# Altium footprint library JL_PCB.PCBLIB: 1112 footprints (part 5 of 71)
Each footprint in its own frame and in the unit in brackets; x right, y up, seen from the top. Pads: shape width x height; smd on the part's side, far side on the other; paste and mask are expansions set on the pad; w line width, h text height; cw(c..) or ccw(c..) is an arc to the next point about the centre after c.
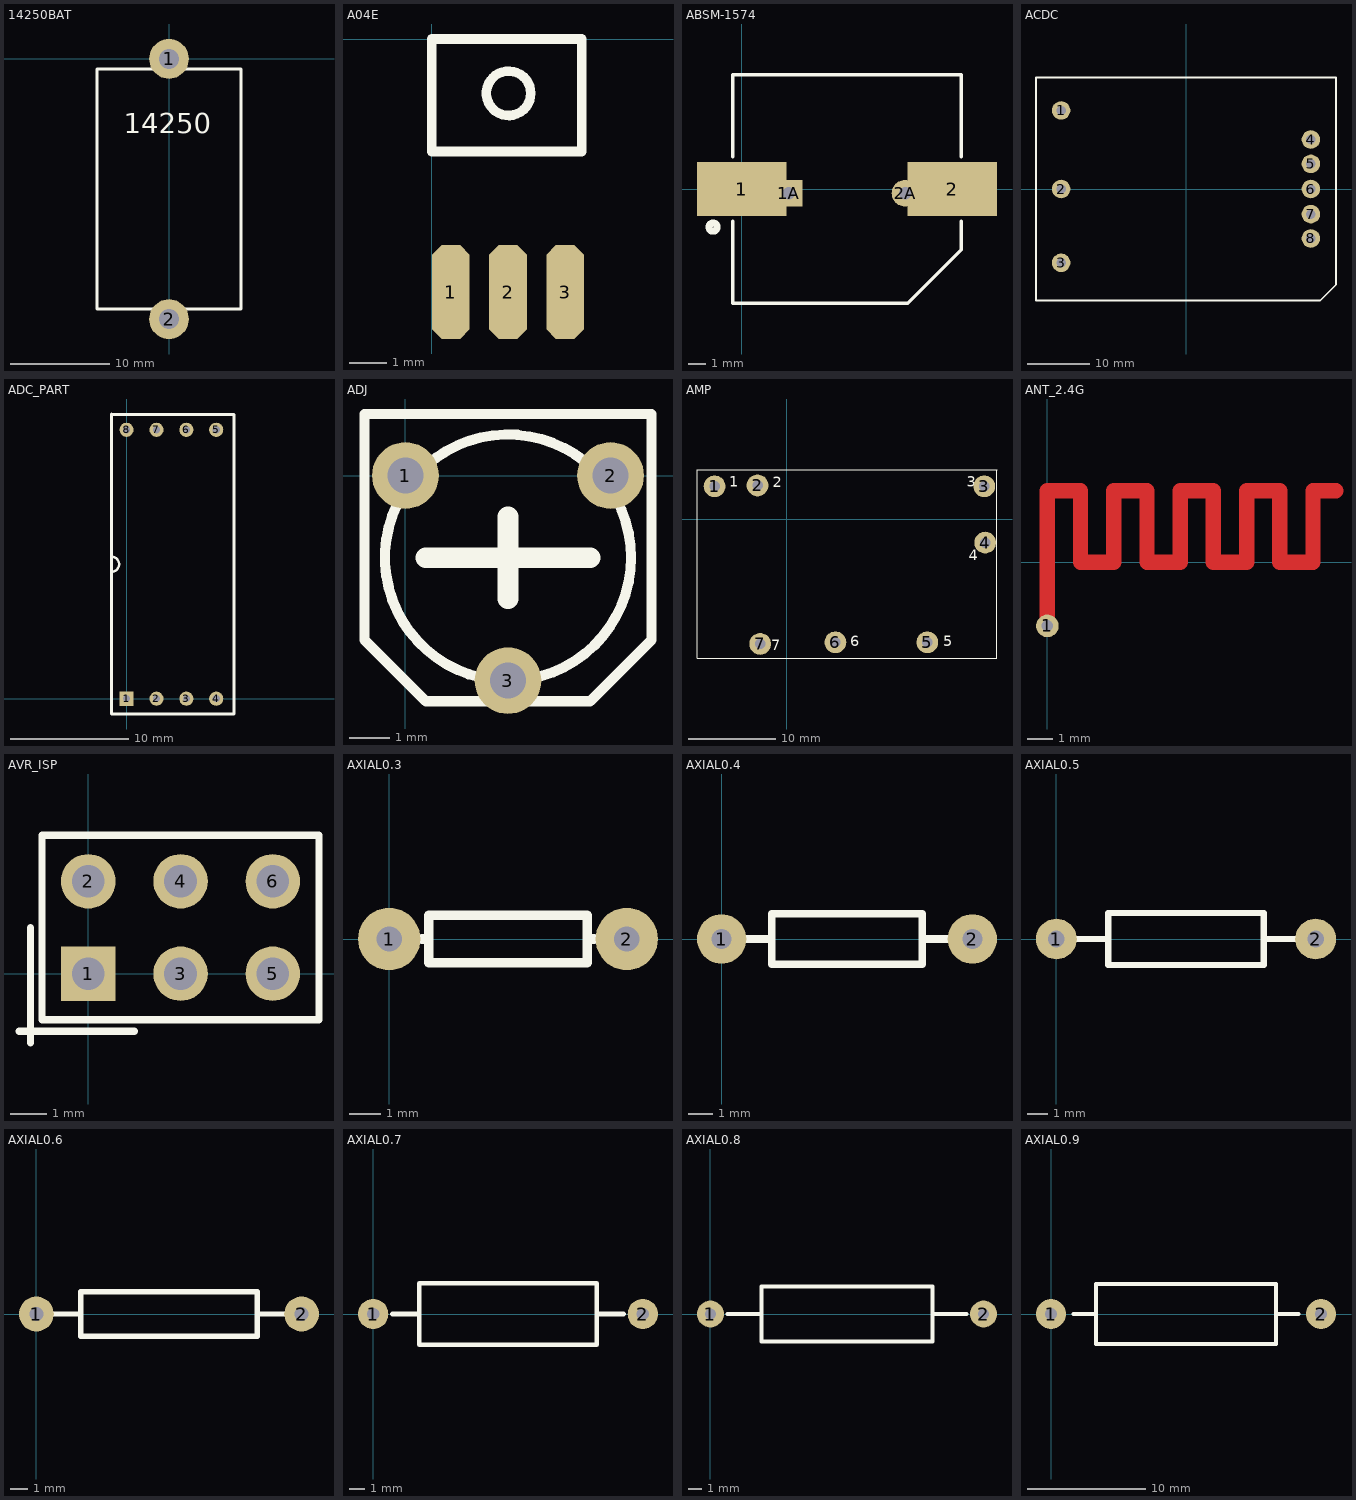
[diagram p4: the footprints below, top view; thin cyan lines are the x and y axes]

## 14250BAT [mm]
pads (2):
  round 4 hole 2: 1(0,0) 2(0,-26.162)
TopOverlay:
  lines w0.254: -7.239,-25.146 0,-25.146 7.239,-25.146 7.239,-1.016 -7.239,-1.016 -7.239,-25.146
  text "14250" at -4.572,-7.493 h2

## A04E [mm] "A04E"
pads (3):
  oct 1x2.5 smd: 1(0.51,-6.75) 2(2.034,-6.75) 3(3.558,-6.75)
TopOverlay:
  circle w0.254: c2.049,-1.448 r0.592
  lines w0.254: 0,-3 4,-3 4,0 0,0 0,-3
3D body "User Library-UA SIP model.step": height 1.59, standoff 0.02, extent -0.055,-9.472 4.115,0.138

## ABSM-1574 [mm] "Magnetic Transducer Buzzer"
pads (4):
  rect 5x3 smd: 1(0,0) 2(11.8,0)
  rect 1.5x1.5 hole 0.7: 1A(2.65,-0.24)
  round 1.5 hole 0.7: 2A(9.15,-0.24)
TopOverlay:
  circle w0.4: c-1.6,-2.134 r0.227
  lines w0.2: -0.5,-1.8 -0.5,-6.4 9.3,-6.4 12.3,-3.4 12.3,-1.8 ; -0.5,1.8 -0.5,6.4 12.3,6.4 12.3,1.8

## ACDC [mm]
pads (8):
  round 3 hole 1.5: 1(-20.193,12.7) 2(-20.193,0) 3(-20.193,-11.938) 4(20.193,8.001) 5(20.193,4.064) 6(20.193,0) 7(20.193,-4.064) 8(20.193,-8.001)
TopOverlay:
  lines w0.254: -24.257,-18.034 -24.257,18.034 24.257,18.034 24.257,-15.494 21.717,-18.034 -24.257,-18.034

## ADC_PART [mm]
pads (8):
  rect 1.2x1.2 hole 0.6: 1(0,0)
  round 1.2 hole 0.6: 2(2.54,0) 3(5.08,0) 4(7.62,0) 5(7.62,22.86) 6(5.08,22.86) 7(2.54,22.86) 8(0,22.86)
TopOverlay:
  lines w0.2: -1.27,2.085 -1.27,10.795 ccw(c-1.27,11.43) -1.27,12.065 -1.27,20.775
  lines w0.254: 0,-1.3 -1.3,-1.3 ; -1.3,-1.3 9.114,-1.3 9.114,24.17 -1.27,24.17 -1.3,24.2 -1.3,22.8 -1.3,-1.3

## ADJ [mil]
pads (3):
  round 65 hole 35: 1(0,0) 2(200,0) 3(100,-200)
TopOverlay:
  circle w10: c100,-80 r120
  lines w10: -40,-160 20,-220 180,-220 240,-160 240,60 -40,60 -40,-160
  lines w20: 20,-80 180,-80 ; 100,-120 100,-40

## AMP [mil]
pads (7):
  round 98 hole 47: 1(-325,148) 2(-132,152) 3(887,148) 4(891,-105) 5(631,-553) 6(218,-553) 7(-120,-560)
TopOverlay:
  lines w4: -403,223 -404,-625 942,-625 943,223 ; -402,222 944,222
  text "4" at 817,-184 h47
  text "2" at -63,143 h47
  text "3" at 808,147 h47
  text "5" at 702,-570 h47
  text "6" at 285,-570 h47
  text "7" at -71,-589 h47
  text "1" at -259,147 h47

## ANT_2.4G [mil]
pads (1):
  round 35 hole 18: 1(0,-98)
TopLayer:
  lines w23.62: 0,-94.49 0,110.24 51.18,110.24 51.18,0 102.36,0 102.36,110.24 153.54,110.24 153.54,0 204.72,0 204.72,110.24 255.91,110.24 255.91,0 307.09,0 307.09,110.24 358.27,110.24 358.27,0 409.45,0 409.45,110.24 444.88,110.24

## AVR_ISP [mm]
pads (6):
  rect 1.5x1.5 hole 0.9: 1(0,0)
  round 1.5 hole 0.9: 2(0,2.54) 3(2.54,0) 4(2.54,2.54) 5(5.08,0) 6(5.08,2.54)
TopOverlay:
  lines w0.2: 1.482,-1.27 6.35,-1.27 ; 6.35,-1.27 -1.27,-1.27 -1.27,3.81 6.35,3.81 6.35,-1.27
  lines w0.203: -1.905,-1.587 1.27,-1.587 ; -1.587,-1.905 -1.587,1.27
3D body "HEADER.STEP": height 7.58, standoff -2.94, extent -1.27,1.27 1.27,3.81
3D body "HEADER.STEP": height 7.58, standoff -2.94, extent 1.27,1.27 3.81,3.81
3D body "HEADER.STEP": height 7.58, standoff -2.94, extent 3.81,1.27 6.35,3.81
3D body "HEADER.STEP": height 7.58, standoff -2.94, extent 3.81,-1.27 6.35,1.27
3D body "HEADER.STEP": height 7.58, standoff -2.94, extent 1.27,-1.27 3.81,1.27
3D body "HEADER.STEP": height 7.58, standoff -2.94, extent -1.27,-1.27 1.27,1.27

## AXIAL0.3 [mm]
pads (2):
  round 2 hole 0.813: 1(0,0) 2(7.62,0)
TopOverlay:
  lines w0.305: 1.041,0 1.27,0 ; 6.579,0 6.35,0 ; 6.35,0 6.35,0.762 1.27,0.762 1.27,-0.762 6.35,-0.762 6.35,0

## AXIAL0.4 [mm]
pads (2):
  round 2 hole 0.813: 1(0,0) 2(10.16,0)
TopOverlay:
  lines w0.305: 1.016,0 2.032,0 ; 8.128,0 9.144,0 ; 2.032,-1.016 2.032,1.016 8.128,1.016 8.128,-1.016 2.032,-1.016

## AXIAL0.5 [mm]
pads (2):
  round 2 hole 0.813: 1(0,0) 2(12.7,0)
TopOverlay:
  lines w0.305: 1.016,0 2.54,0 ; 10.16,0 11.684,0 ; 2.54,-1.27 2.54,1.27 10.16,1.27 10.16,-1.27 2.54,-1.27

## AXIAL0.6 [mm]
pads (2):
  round 2 hole 0.813: 1(0,0) 2(15.24,0)
TopOverlay:
  lines w0.305: 1.016,0 2.54,0 ; 12.7,0 14.224,0 ; 2.54,-1.27 2.54,1.27 12.7,1.27 12.7,-1.27 2.54,-1.27

## AXIAL0.7 [mm]
pads (2):
  round 2 hole 0.813: 1(0,0) 2(17.78,0)
TopOverlay:
  lines w0.305: 1.27,0 3.048,0 ; 14.732,0 16.51,0 ; 3.048,-2.032 14.732,-2.032 14.732,2.032 3.048,2.032 3.048,-2.032

## AXIAL0.8 [mm]
pads (2):
  round 2 hole 0.813: 1(0,0) 2(20.32,0)
TopOverlay:
  lines w0.305: 1.27,0 3.81,0 ; 16.51,0 19.05,0 ; 3.81,-2.032 3.81,2.032 16.51,2.032 16.51,-2.032 3.81,-2.032

## AXIAL0.9 [mil]
pads (2):
  round 100 hole 40: 1(0,0) 2(900,0)
TopOverlay:
  lines w12: 75,0 150,0 ; 750,0 825,0 ; 150,-100 750,-100 750,100 150,100 150,-100